# Altium footprint library SAMTEC THD.PcbLib: 161 footprints (part 12 of 12)
Each footprint in its own frame and in the unit in brackets; x right, y up, seen from the top. Pads: shape width x height; smd on the part's side, far side on the other; paste and mask are expansions set on the pad; w line width, h text height; cw(c..) or ccw(c..) is an arc to the next point about the centre after c.
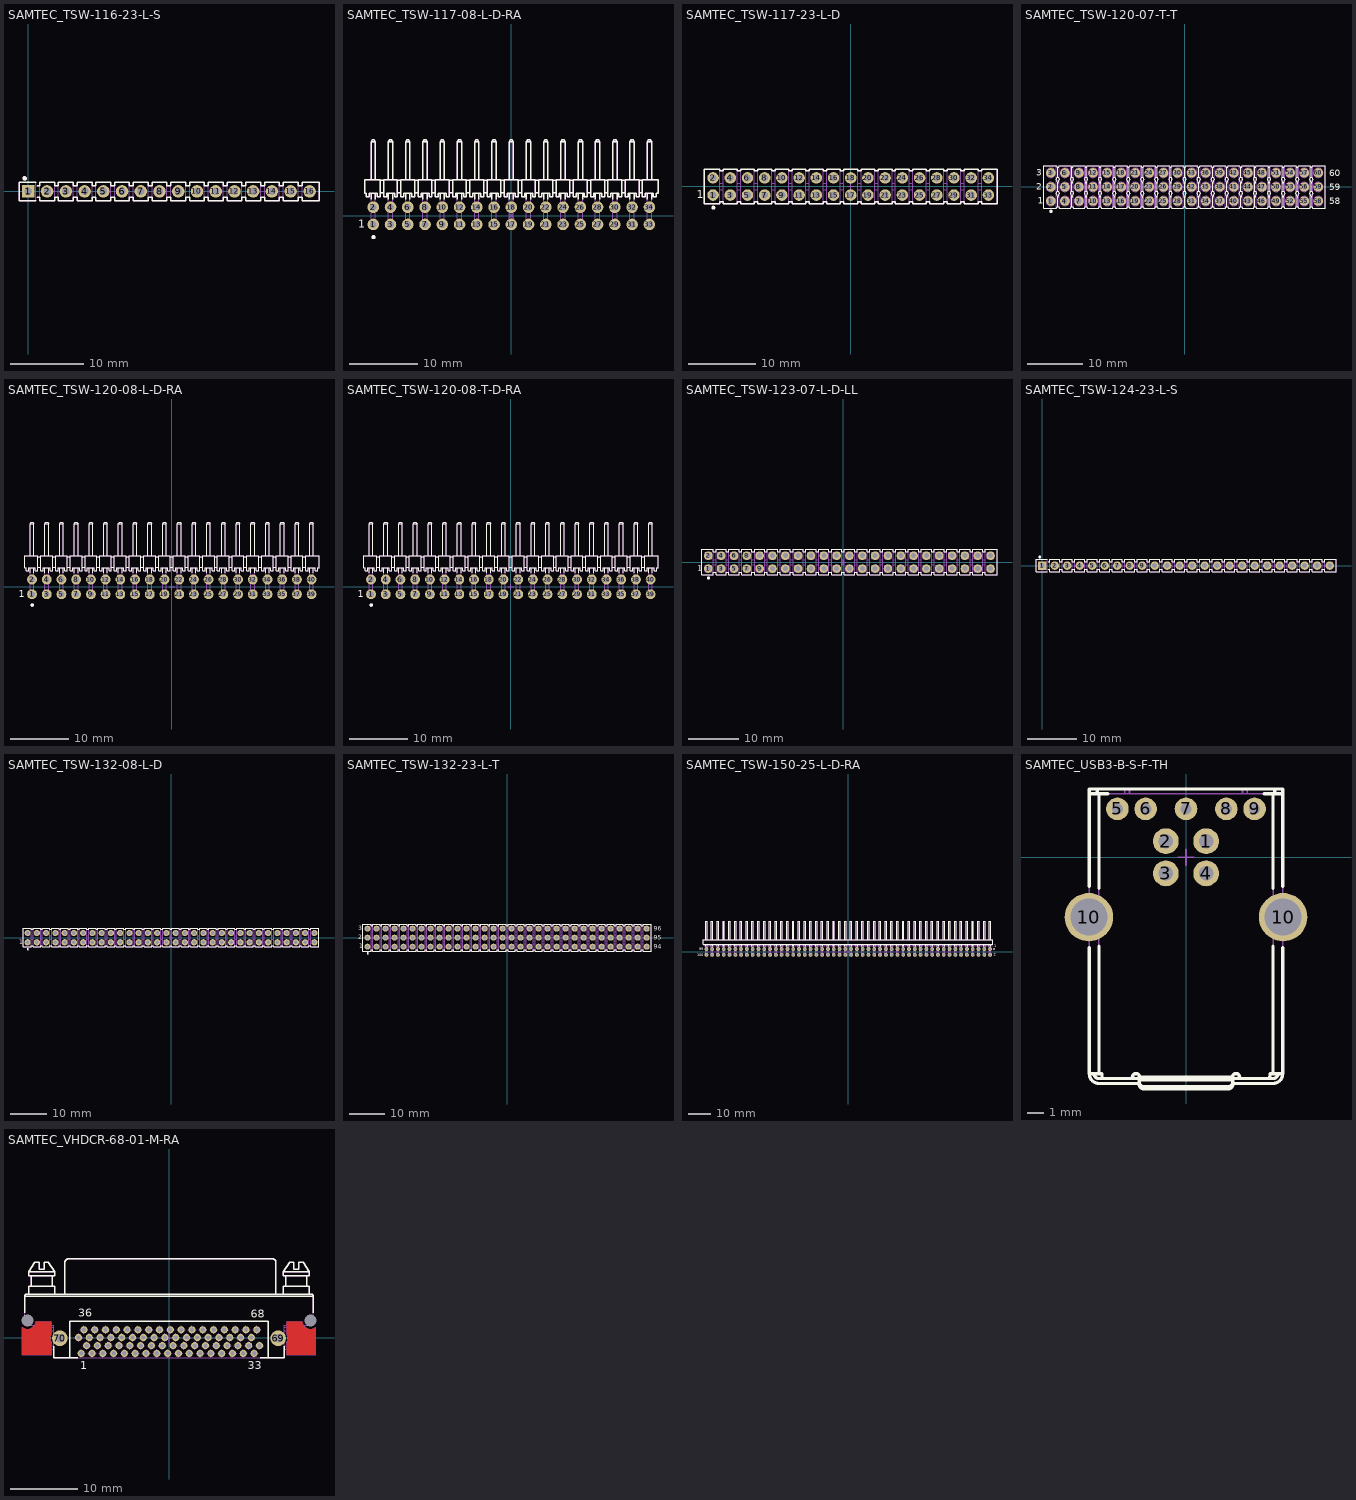
[diagram p11: the footprints below, top view; thin cyan lines are the x and y axes]

## SAMTEC_TSW-116-23-L-S [mm] "16 Contacts - Pitch 2.54mm - Single Row  Through Mount Straigh Header (Post Lead 5.84mm, Tail Lead 2.92mm, Insulator 2.54mm)"
height 8.38
pads (16):
  rect 1.7x1.7 hole 1: 1(0,0)
  round 1.7 hole 1: 2(2.54,0) 3(5.08,0) 4(7.62,0) 5(10.16,0) 6(12.7,0) 7(15.24,0) 8(17.78,0) 9(20.32,0) 10(22.86,0) 11(25.4,0) 12(27.94,0) 13(30.48,0) 14(33.02,0) 15(35.56,0) 16(38.13,0)
Top Overlay:
  drawing of 151 lines, arcs and shapes, not listed
Mechanical 8:
  lines w0.1: -0.5,0 0,0 ; 0,-0.5 0,0 ; 0,0.5 0,0 ; 0.5,0 0,0 ; 2.04,0 2.54,0 ; 2.54,-0.5 2.54,0 ; 2.54,0.5 2.54,0 ; 3.04,0 2.54,0 ; 4.58,0 5.08,0 ; 5.08,-0.5 5.08,0 ; 5.08,0.5 5.08,0 ; 5.58,0 5.08,0 ; 7.12,0 7.62,0 ; 7.62,-0.5 7.62,0 ; 7.62,0.5 7.62,0 ; 8.12,0 7.62,0 ; 9.66,0 10.16,0 ; 10.16,-0.5 10.16,0 ; 10.16,0.5 10.16,0 ; 10.66,0 10.16,0 ; 12.2,0 12.7,0 ; 12.7,-0.5 12.7,0 ; 12.7,0.5 12.7,0 ; 13.2,0 12.7,0 ; 14.74,0 15.24,0 ; 15.24,-0.5 15.24,0 ; 15.24,0.5 15.24,0 ; 15.74,0 15.24,0 ; 17.28,0 17.78,0 ; 17.78,-0.5 17.78,0 ; 17.78,0.5 17.78,0 ; 18.28,0 17.78,0 ; 19.82,0 20.32,0 ; 20.32,-0.5 20.32,0 ; 20.32,0.5 20.32,0 ; 20.82,0 20.32,0 ; 22.36,0 22.86,0 ; 22.86,-0.5 22.86,0 ; 22.86,0.5 22.86,0 ; 23.36,0 22.86,0 ; 24.9,0 25.4,0 ; 25.4,-0.5 25.4,0 ; 25.4,0.5 25.4,0 ; 25.9,0 25.4,0 ; 27.44,0 27.94,0 ; 27.94,-0.5 27.94,0 ; 27.94,0.5 27.94,0 ; 28.44,0 27.94,0 ; 29.98,0 30.48,0 ; 30.48,-0.5 30.48,0 ; 30.48,0.5 30.48,0 ; 30.98,0 30.48,0 ; 32.52,0 33.02,0 ; 33.02,-0.5 33.02,0 ; 33.02,0.5 33.02,0 ; 33.52,0 33.02,0 ; 35.06,0 35.56,0 ; 35.56,-0.5 35.56,0 ; 35.56,0.5 35.56,0 ; 36.06,0 35.56,0 ; 37.63,0 38.13,0 ; 38.13,-0.5 38.13,0 ; 38.13,0.5 38.13,0 ; 38.63,0 38.13,0
Mechanical 14:
  drawing of 185 lines, arcs and shapes, not listed
3D body "SAMTEC_TSW-116-23-L-S.stp": height 8.38, standoff -2.92, extent -1.27,-1.27 39.37,1.27

## SAMTEC_TSW-117-08-L-D-RA [mm] "34 Contacts - Pitch 2.54mm - Dual Row Through Mount  Right Angle Header (Post Lead 5.84mm, Tail Lead 5.08mm, Insulator 2.54mm)"
height 5.56
pads (34):
  round 1.7 hole 1: 1(-20.32,-1.27) 2(-20.32,1.27) 3(-17.78,-1.27) 4(-17.78,1.27) 5(-15.24,-1.27) 6(-15.24,1.27) 7(-12.7,-1.27) 8(-12.7,1.27) 9(-10.16,-1.27) 10(-10.16,1.27) 11(-7.62,-1.27) 12(-7.62,1.27) 13(-5.08,-1.27) 14(-5.08,1.27) 15(-2.54,-1.27) 16(-2.54,1.27) 17(0,-1.27) 18(0,1.27) 19(2.54,-1.27) 20(2.54,1.27) 21(5.08,-1.27) 22(5.08,1.27) 23(7.62,-1.27) 24(7.62,1.27) 25(10.16,-1.27) 26(10.16,1.27) 27(12.7,-1.27) 28(12.7,1.27) 29(15.24,-1.27) 30(15.24,1.27) 31(17.78,-1.27) 32(17.78,1.27) 33(20.32,-1.27) 34(20.32,1.27)
Top Overlay:
  drawing of 309 lines, arcs and shapes, not listed
  text "1" at -22.567,-1.768 h1.2
Mechanical 8:
  lines w0.1: -20.82,-1.27 -20.32,-1.27 ; -20.82,1.27 -20.32,1.27 ; -20.32,-1.77 -20.32,-1.27 ; -20.32,-0.77 -20.32,-1.27 ; -20.32,0.77 -20.32,1.27 ; -20.32,1.77 -20.32,1.27 ; -19.82,-1.27 -20.32,-1.27 ; -19.82,1.27 -20.32,1.27 ; -18.28,-1.27 -17.78,-1.27 ; -18.28,1.27 -17.78,1.27 ; -17.78,-1.77 -17.78,-1.27 ; -17.78,-0.77 -17.78,-1.27 ; -17.78,0.77 -17.78,1.27 ; -17.78,1.77 -17.78,1.27 ; -17.28,-1.27 -17.78,-1.27 ; -17.28,1.27 -17.78,1.27 ; -15.74,-1.27 -15.24,-1.27 ; -15.74,1.27 -15.24,1.27 ; -15.24,-1.77 -15.24,-1.27 ; -15.24,-0.77 -15.24,-1.27 ; -15.24,0.77 -15.24,1.27 ; -15.24,1.77 -15.24,1.27 ; -14.74,-1.27 -15.24,-1.27 ; -14.74,1.27 -15.24,1.27 ; -13.2,-1.27 -12.7,-1.27 ; -13.2,1.27 -12.7,1.27 ; -12.7,-1.77 -12.7,-1.27 ; -12.7,-0.77 -12.7,-1.27 ; -12.7,0.77 -12.7,1.27 ; -12.7,1.77 -12.7,1.27 ; -12.2,-1.27 -12.7,-1.27 ; -12.2,1.27 -12.7,1.27 ; -10.66,-1.27 -10.16,-1.27 ; -10.66,1.27 -10.16,1.27 ; -10.16,-1.77 -10.16,-1.27 ; -10.16,-0.77 -10.16,-1.27 ; -10.16,0.77 -10.16,1.27 ; -10.16,1.77 -10.16,1.27 ; -9.66,-1.27 -10.16,-1.27 ; -9.66,1.27 -10.16,1.27 ; -8.12,-1.27 -7.62,-1.27 ; -8.12,1.27 -7.62,1.27 ; -7.62,-1.77 -7.62,-1.27 ; -7.62,-0.77 -7.62,-1.27 ; -7.62,0.77 -7.62,1.27 ; -7.62,1.77 -7.62,1.27 ; -7.12,-1.27 -7.62,-1.27 ; -7.12,1.27 -7.62,1.27 ; -5.58,-1.27 -5.08,-1.27 ; -5.58,1.27 -5.08,1.27 ; -5.08,-1.77 -5.08,-1.27 ; -5.08,-0.77 -5.08,-1.27 ; -5.08,0.77 -5.08,1.27 ; -5.08,1.77 -5.08,1.27 ; -4.58,-1.27 -5.08,-1.27 ; -4.58,1.27 -5.08,1.27 ; -3.04,-1.27 -2.54,-1.27 ; -3.04,1.27 -2.54,1.27 ; -2.54,-1.77 -2.54,-1.27 ; -2.54,-0.77 -2.54,-1.27 ; -2.54,0.77 -2.54,1.27 ; -2.54,1.77 -2.54,1.27 ; -2.04,-1.27 -2.54,-1.27 ; -2.04,1.27 -2.54,1.27 ; -0.5,-1.27 0,-1.27 ; -0.5,1.27 0,1.27 ; -0.354,-0.354 0,0 ; -0.354,0.354 0,0 ; 0,-1.77 0,-1.27 ; 0,-0.77 0,-1.27 ; 0,0.77 0,1.27 ; 0,1.77 0,1.27 ; 0.354,-0.354 0,0 ; 0.354,0.354 0,0 ; 0.5,-1.27 0,-1.27 ; 0.5,1.27 0,1.27 ; 2.04,-1.27 2.54,-1.27 ; 2.04,1.27 2.54,1.27 ; 2.54,-1.77 2.54,-1.27 ; 2.54,-0.77 2.54,-1.27 ; 2.54,0.77 2.54,1.27 ; 2.54,1.77 2.54,1.27 ; 3.04,-1.27 2.54,-1.27 ; 3.04,1.27 2.54,1.27 ; 4.58,-1.27 5.08,-1.27 ; 4.58,1.27 5.08,1.27 ; 5.08,-1.77 5.08,-1.27 ; 5.08,-0.77 5.08,-1.27 ; 5.08,0.77 5.08,1.27 ; 5.08,1.77 5.08,1.27 ; 5.58,-1.27 5.08,-1.27 ; 5.58,1.27 5.08,1.27 ; 7.12,-1.27 7.62,-1.27 ; 7.12,1.27 7.62,1.27 ; 7.62,-1.77 7.62,-1.27 ; 7.62,-0.77 7.62,-1.27 ; 7.62,0.77 7.62,1.27 ; 7.62,1.77 7.62,1.27 ; 8.12,-1.27 7.62,-1.27 ; 8.12,1.27 7.62,1.27 ; 9.66,-1.27 10.16,-1.27 ; 9.66,1.27 10.16,1.27 ; 10.16,-1.77 10.16,-1.27 ; 10.16,-0.77 10.16,-1.27 ; 10.16,0.77 10.16,1.27 ; 10.16,1.77 10.16,1.27 ; 10.66,-1.27 10.16,-1.27 ; 10.66,1.27 10.16,1.27 ; 12.2,-1.27 12.7,-1.27 ; 12.2,1.27 12.7,1.27 ; 12.7,-1.77 12.7,-1.27 ; 12.7,-0.77 12.7,-1.27 ; 12.7,0.77 12.7,1.27 ; 12.7,1.77 12.7,1.27 ; 13.2,-1.27 12.7,-1.27 ; 13.2,1.27 12.7,1.27 ; 14.74,-1.27 15.24,-1.27 ; 14.74,1.27 15.24,1.27 ; 15.24,-1.77 15.24,-1.27 ; 15.24,-0.77 15.24,-1.27 ; 15.24,0.77 15.24,1.27 ; 15.24,1.77 15.24,1.27 ; 15.74,-1.27 15.24,-1.27 ; 15.74,1.27 15.24,1.27 ; 17.28,-1.27 17.78,-1.27 ; 17.28,1.27 17.78,1.27 ; 17.78,-1.77 17.78,-1.27 ; 17.78,-0.77 17.78,-1.27 ; 17.78,0.77 17.78,1.27 ; 17.78,1.77 17.78,1.27 ; 18.28,-1.27 17.78,-1.27 ; 18.28,1.27 17.78,1.27 ; 19.82,-1.27 20.32,-1.27 ; 19.82,1.27 20.32,1.27 ; 20.32,-1.77 20.32,-1.27 ; 20.32,-0.77 20.32,-1.27 ; 20.32,0.77 20.32,1.27 ; 20.32,1.77 20.32,1.27 ; 20.82,-1.27 20.32,-1.27 ; 20.82,1.27 20.32,1.27
Mechanical 14:
  drawing of 326 lines, arcs and shapes, not listed
  text "1" at -22.567,-1.768 h1.2
3D body "SAMTEC_TSW-117-08-L-D-RA.stp": height 5.56, standoff -2.29, extent -21.59,-1.587 21.59,11.176

## SAMTEC_TSW-117-23-L-D [mm] "34 Contacts - Pitch 2.54mm - Dual Row  Through Mount Straigh Header (Post Lead 5.84mm, Tail Lead 2.92mm, Insulator 2.54mm)"
height 8.38
pads (34):
  round 1.7 hole 1: 1(-20.32,-1.27) 2(-20.32,1.27) 3(-17.78,-1.27) 4(-17.78,1.27) 5(-15.24,-1.27) 6(-15.24,1.27) 7(-12.7,-1.27) 8(-12.7,1.27) 9(-10.16,-1.27) 10(-10.16,1.27) 11(-7.62,-1.27) 12(-7.62,1.27) 13(-5.08,-1.27) 14(-5.08,1.27) 15(-2.54,-1.27) 16(-2.54,1.27) 17(0,-1.27) 18(0,1.27) 19(2.54,-1.27) 20(2.54,1.27) 21(5.08,-1.27) 22(5.08,1.27) 23(7.62,-1.27) 24(7.62,1.27) 25(10.16,-1.27) 26(10.16,1.27) 27(12.7,-1.27) 28(12.7,1.27) 29(15.24,-1.27) 30(15.24,1.27) 31(17.78,-1.27) 32(17.78,1.27) 33(20.32,-1.27) 34(20.32,1.27)
Top Overlay:
  circle w0.3: c-20.285,-3.135 r0.15
  lines w0.2: -21.59,-2.54 -21.59,2.54 -19.304,2.54 -19.304,2.286 -18.796,2.286 -18.796,2.54 -16.764,2.54 -16.764,2.286 -16.256,2.286 -16.256,2.54 -14.224,2.54 -14.224,2.286 -13.716,2.286 -13.716,2.54 -11.684,2.54 -11.684,2.286 -11.176,2.286 -11.176,2.54 -9.144,2.54 -9.144,2.286 -8.636,2.286 -8.636,2.54 -6.604,2.54 -6.604,2.286 -6.096,2.286 -6.096,2.54 -4.064,2.54 -4.064,2.286 -3.556,2.286 -3.556,2.54 -1.524,2.54 -1.524,2.286 -1.016,2.286 -1.016,2.54 1.016,2.54 1.016,2.286 1.524,2.286 1.524,2.54 3.556,2.54 3.556,2.286 4.064,2.286 4.064,2.54 6.096,2.54 6.096,2.286 6.604,2.286 6.604,2.54 8.636,2.54 8.636,2.286 9.144,2.286 9.144,2.54 11.176,2.54 11.176,2.286 11.684,2.286 11.684,2.54 13.716,2.54 13.716,2.286 14.224,2.286 14.224,2.54 16.256,2.54 16.256,2.286 16.764,2.286 16.764,2.54 18.796,2.54 18.796,2.286 19.304,2.286 19.304,2.54 21.59,2.54 21.59,-2.54 19.304,-2.54 19.304,-2.286 18.796,-2.286 18.796,-2.54 16.764,-2.54 16.764,-2.286 16.256,-2.286 16.256,-2.54 14.224,-2.54 14.224,-2.286 13.716,-2.286 13.716,-2.54 11.684,-2.54 11.684,-2.286 11.176,-2.286 11.176,-2.54 9.144,-2.54 9.144,-2.286 8.636,-2.286 8.636,-2.54 6.604,-2.54 6.604,-2.286 6.096,-2.286 6.096,-2.54 4.064,-2.54 4.064,-2.286 3.556,-2.286 3.556,-2.54 1.524,-2.54 1.524,-2.286 1.016,-2.286 1.016,-2.54 -1.016,-2.54 -1.016,-2.286 -1.524,-2.286 -1.524,-2.54 -3.556,-2.54 -3.556,-2.286 -4.064,-2.286 -4.064,-2.54 -6.096,-2.54 -6.096,-2.286 -6.604,-2.286 -6.604,-2.54 -8.636,-2.54 -8.636,-2.286 -9.144,-2.286 -9.144,-2.54 -11.176,-2.54 -11.176,-2.286 -11.684,-2.286 -11.684,-2.54 -13.716,-2.54 -13.716,-2.286 -14.224,-2.286 -14.224,-2.54 -16.256,-2.54 -16.256,-2.286 -16.764,-2.286 -16.764,-2.54 -18.796,-2.54 -18.796,-2.286 -19.304,-2.286 -19.304,-2.54 -21.59,-2.54
  text "1" at -22.692,-1.768 h1.2
Mechanical 8:
  lines w0.05: -20.82,-1.27 -20.32,-1.27 ; -20.82,1.27 -20.32,1.27 ; -20.32,-1.77 -20.32,-1.27 ; -20.32,-0.77 -20.32,-1.27 ; -20.32,0.77 -20.32,1.27 ; -20.32,1.77 -20.32,1.27 ; -19.82,-1.27 -20.32,-1.27 ; -19.82,1.27 -20.32,1.27 ; -18.28,-1.27 -17.78,-1.27 ; -18.28,1.27 -17.78,1.27 ; -17.78,-1.77 -17.78,-1.27 ; -17.78,-0.77 -17.78,-1.27 ; -17.78,0.77 -17.78,1.27 ; -17.78,1.77 -17.78,1.27 ; -17.28,-1.27 -17.78,-1.27 ; -17.28,1.27 -17.78,1.27 ; -15.74,-1.27 -15.24,-1.27 ; -15.74,1.27 -15.24,1.27 ; -15.24,-1.77 -15.24,-1.27 ; -15.24,-0.77 -15.24,-1.27 ; -15.24,0.77 -15.24,1.27 ; -15.24,1.77 -15.24,1.27 ; -14.74,-1.27 -15.24,-1.27 ; -14.74,1.27 -15.24,1.27 ; -13.2,-1.27 -12.7,-1.27 ; -13.2,1.27 -12.7,1.27 ; -12.7,-1.77 -12.7,-1.27 ; -12.7,-0.77 -12.7,-1.27 ; -12.7,0.77 -12.7,1.27 ; -12.7,1.77 -12.7,1.27 ; -12.2,-1.27 -12.7,-1.27 ; -12.2,1.27 -12.7,1.27 ; -10.66,-1.27 -10.16,-1.27 ; -10.66,1.27 -10.16,1.27 ; -10.16,-1.77 -10.16,-1.27 ; -10.16,-0.77 -10.16,-1.27 ; -10.16,0.77 -10.16,1.27 ; -10.16,1.77 -10.16,1.27 ; -9.66,-1.27 -10.16,-1.27 ; -9.66,1.27 -10.16,1.27 ; -8.12,-1.27 -7.62,-1.27 ; -8.12,1.27 -7.62,1.27 ; -7.62,-1.77 -7.62,-1.27 ; -7.62,-0.77 -7.62,-1.27 ; -7.62,0.77 -7.62,1.27 ; -7.62,1.77 -7.62,1.27 ; -7.12,-1.27 -7.62,-1.27 ; -7.12,1.27 -7.62,1.27 ; -5.58,-1.27 -5.08,-1.27 ; -5.58,1.27 -5.08,1.27 ; -5.08,-1.77 -5.08,-1.27 ; -5.08,-0.77 -5.08,-1.27 ; -5.08,0.77 -5.08,1.27 ; -5.08,1.77 -5.08,1.27 ; -4.58,-1.27 -5.08,-1.27 ; -4.58,1.27 -5.08,1.27 ; -3.04,-1.27 -2.54,-1.27 ; -3.04,1.27 -2.54,1.27 ; -2.54,-1.77 -2.54,-1.27 ; -2.54,-0.77 -2.54,-1.27 ; -2.54,0.77 -2.54,1.27 ; -2.54,1.77 -2.54,1.27 ; -2.04,-1.27 -2.54,-1.27 ; -2.04,1.27 -2.54,1.27 ; -0.5,-1.27 0,-1.27 ; -0.5,0 0,0 ; -0.5,1.27 0,1.27 ; 0,-1.77 0,-1.27 ; 0,-0.77 0,-1.27 ; 0,-0.5 0,0 ; 0,0.5 0,0 ; 0,0.77 0,1.27 ; 0,1.77 0,1.27 ; 0.5,-1.27 0,-1.27 ; 0.5,0 0,0 ; 0.5,1.27 0,1.27 ; 2.04,-1.27 2.54,-1.27 ; 2.04,1.27 2.54,1.27 ; 2.54,-1.77 2.54,-1.27 ; 2.54,-0.77 2.54,-1.27 ; 2.54,0.77 2.54,1.27 ; 2.54,1.77 2.54,1.27 ; 3.04,-1.27 2.54,-1.27 ; 3.04,1.27 2.54,1.27 ; 4.58,-1.27 5.08,-1.27 ; 4.58,1.27 5.08,1.27 ; 5.08,-1.77 5.08,-1.27 ; 5.08,-0.77 5.08,-1.27 ; 5.08,0.77 5.08,1.27 ; 5.08,1.77 5.08,1.27 ; 5.58,-1.27 5.08,-1.27 ; 5.58,1.27 5.08,1.27 ; 7.12,-1.27 7.62,-1.27 ; 7.12,1.27 7.62,1.27 ; 7.62,-1.77 7.62,-1.27 ; 7.62,-0.77 7.62,-1.27 ; 7.62,0.77 7.62,1.27 ; 7.62,1.77 7.62,1.27 ; 8.12,-1.27 7.62,-1.27 ; 8.12,1.27 7.62,1.27 ; 9.66,-1.27 10.16,-1.27 ; 9.66,1.27 10.16,1.27 ; 10.16,-1.77 10.16,-1.27 ; 10.16,-0.77 10.16,-1.27 ; 10.16,0.77 10.16,1.27 ; 10.16,1.77 10.16,1.27 ; 10.66,-1.27 10.16,-1.27 ; 10.66,1.27 10.16,1.27 ; 12.2,-1.27 12.7,-1.27 ; 12.2,1.27 12.7,1.27 ; 12.7,-1.77 12.7,-1.27 ; 12.7,-0.77 12.7,-1.27 ; 12.7,0.77 12.7,1.27 ; 12.7,1.77 12.7,1.27 ; 13.2,-1.27 12.7,-1.27 ; 13.2,1.27 12.7,1.27 ; 14.74,-1.27 15.24,-1.27 ; 14.74,1.27 15.24,1.27 ; 15.24,-1.77 15.24,-1.27 ; 15.24,-0.77 15.24,-1.27 ; 15.24,0.77 15.24,1.27 ; 15.24,1.77 15.24,1.27 ; 15.74,-1.27 15.24,-1.27 ; 15.74,1.27 15.24,1.27 ; 17.28,-1.27 17.78,-1.27 ; 17.28,1.27 17.78,1.27 ; 17.78,-1.77 17.78,-1.27 ; 17.78,-0.77 17.78,-1.27 ; 17.78,0.77 17.78,1.27 ; 17.78,1.77 17.78,1.27 ; 18.28,-1.27 17.78,-1.27 ; 18.28,1.27 17.78,1.27 ; 19.82,-1.27 20.32,-1.27 ; 19.82,1.27 20.32,1.27 ; 20.32,-1.77 20.32,-1.27 ; 20.32,-0.77 20.32,-1.27 ; 20.32,0.77 20.32,1.27 ; 20.32,1.77 20.32,1.27 ; 20.82,-1.27 20.32,-1.27 ; 20.82,1.27 20.32,1.27
Mechanical 14:
  lines w0.1: -19.304,-2.286 -18.796,-2.286 ; -19.304,-0.508 -18.796,-0.508 ; -19.304,0.508 -18.796,0.508 ; -19.304,2.286 -18.796,2.286 ; -16.764,-2.286 -16.256,-2.286 ; -16.764,-0.508 -16.256,-0.508 ; -16.764,0.508 -16.256,0.508 ; -16.764,2.286 -16.256,2.286 ; -14.224,-2.286 -13.716,-2.286 ; -14.224,-0.508 -13.716,-0.508 ; -14.224,0.508 -13.716,0.508 ; -14.224,2.286 -13.716,2.286 ; -11.684,-2.286 -11.176,-2.286 ; -11.684,-0.508 -11.176,-0.508 ; -11.684,0.508 -11.176,0.508 ; -11.684,2.286 -11.176,2.286 ; -9.144,-2.286 -8.636,-2.286 ; -9.144,-0.508 -8.636,-0.508 ; -9.144,0.508 -8.636,0.508 ; -9.144,2.286 -8.636,2.286 ; -6.604,-2.286 -6.096,-2.286 ; -6.604,-0.508 -6.096,-0.508 ; -6.604,0.508 -6.096,0.508 ; -6.604,2.286 -6.096,2.286 ; -4.064,-2.286 -3.556,-2.286 ; -4.064,-0.508 -3.556,-0.508 ; -4.064,0.508 -3.556,0.508 ; -4.064,2.286 -3.556,2.286 ; -1.524,-2.286 -1.016,-2.286 ; -1.524,-0.508 -1.016,-0.508 ; -1.524,0.508 -1.016,0.508 ; -1.524,2.286 -1.016,2.286 ; 1.016,-2.286 1.524,-2.286 ; 1.016,-0.508 1.524,-0.508 ; 1.016,0.508 1.524,0.508 ; 1.016,2.286 1.524,2.286 ; 3.556,-2.286 4.064,-2.286 ; 3.556,-0.508 4.064,-0.508 ; 3.556,0.508 4.064,0.508 ; 3.556,2.286 4.064,2.286 ; 6.096,-2.286 6.604,-2.286 ; 6.096,-0.508 6.604,-0.508 ; 6.096,0.508 6.604,0.508 ; 6.096,2.286 6.604,2.286 ; 8.636,-2.286 9.144,-2.286 ; 8.636,-0.508 9.144,-0.508 ; 8.636,0.508 9.144,0.508 ; 8.636,2.286 9.144,2.286 ; 11.176,-2.286 11.684,-2.286 ; 11.176,-0.508 11.684,-0.508 ; 11.176,0.508 11.684,0.508 ; 11.176,2.286 11.684,2.286 ; 13.716,-2.286 14.224,-2.286 ; 13.716,-0.508 14.224,-0.508 ; 13.716,0.508 14.224,0.508 ; 13.716,2.286 14.224,2.286 ; 16.256,-2.286 16.764,-2.286 ; 16.256,-0.508 16.764,-0.508 ; 16.256,0.508 16.764,0.508 ; 16.256,2.286 16.764,2.286 ; 18.796,-2.286 19.304,-2.286 ; 18.796,-0.508 19.304,-0.508 ; 18.796,0.508 19.304,0.508 ; 18.796,2.286 19.304,2.286 ; -21.59,-2.54 -19.304,-2.54 -19.304,2.54 -21.59,2.54 -21.59,-2.54 ; -18.796,-2.54 -16.764,-2.54 -16.764,2.54 -18.796,2.54 -18.796,-2.54 ; -16.256,-2.54 -16.256,2.54 -14.224,2.54 -14.224,-2.54 -16.256,-2.54 ; -13.716,-2.54 -11.684,-2.54 -11.684,2.54 -13.716,2.54 -13.716,-2.54 ; -11.176,-2.54 -9.144,-2.54 -9.144,2.54 -11.176,2.54 -11.176,-2.54 ; -8.636,-2.54 -6.604,-2.54 -6.604,2.54 -8.636,2.54 -8.636,-2.54 ; -6.096,-2.54 -4.064,-2.54 -4.064,2.54 -6.096,2.54 -6.096,-2.54 ; -3.556,-2.54 -1.524,-2.54 -1.524,2.54 -3.556,2.54 -3.556,-2.54 ; -1.016,-2.54 1.016,-2.54 1.016,2.54 -1.016,2.54 -1.016,-2.54 ; 1.524,-2.54 3.556,-2.54 3.556,2.54 1.524,2.54 1.524,-2.54 ; 4.064,-2.54 6.096,-2.54 6.096,2.54 4.064,2.54 4.064,-2.54 ; 6.604,-2.54 8.636,-2.54 8.636,2.54 6.604,2.54 6.604,-2.54 ; 9.144,-2.54 11.176,-2.54 11.176,2.54 9.144,2.54 9.144,-2.54 ; 11.684,-2.54 13.716,-2.54 13.716,2.54 11.684,2.54 11.684,-2.54 ; 14.224,-2.54 16.256,-2.54 16.256,2.54 14.224,2.54 14.224,-2.54 ; 16.764,-2.54 18.796,-2.54 18.796,2.54 16.764,2.54 16.764,-2.54 ; 19.304,-2.54 21.59,-2.54 21.59,2.54 19.304,2.54 19.304,-2.54
3D body "SAMTEC_TSW-117-23-L-D.stp": height 8.38, standoff -2.92, extent -21.59,-2.54 21.59,2.54

## SAMTEC_TSW-120-07-T-T [mm] "60 Contacts - Pitch 2.54mm - Triple Row Through Mount Straigh Header (Post Lead 5.84mm, Tail Lead 2.54mm, Insulator 2.54mm)"
height 8.38
pads (60):
  round 1.7 hole 1: 1(-24.13,-2.54) 2(-24.13,0) 3(-24.13,2.54) 4(-21.59,-2.54) 5(-21.59,0) 6(-21.59,2.54) 7(-19.05,-2.54) 8(-19.05,0) 9(-19.05,2.54) 10(-16.51,-2.54) 11(-16.51,0) 12(-16.51,2.54) 13(-13.97,-2.54) 14(-13.97,0) 15(-13.97,2.54) 16(-11.43,-2.54) 17(-11.43,0) 18(-11.43,2.54) 19(-8.89,-2.54) 20(-8.89,0) 21(-8.89,2.54) 22(-6.35,-2.54) 23(-6.35,0) 24(-6.35,2.54) 25(-3.81,-2.54) 26(-3.81,0) 27(-3.81,2.54) 28(-1.27,-2.54) 29(-1.27,0) 30(-1.27,2.54) 31(1.27,-2.54) 32(1.27,0) 33(1.27,2.54) 34(3.81,-2.54) 35(3.81,0) 36(3.81,2.54) 37(6.35,-2.54) 38(6.35,0) 39(6.35,2.54) 40(8.89,-2.54) 41(8.89,0) 42(8.89,2.54) 43(11.43,-2.54) 44(11.43,0) 45(11.43,2.54) 46(13.97,-2.54) 47(13.97,0) 48(13.97,2.54) 49(16.51,-2.54) 50(16.51,0) 51(16.51,2.54) 52(19.05,-2.54) 53(19.05,0) 54(19.05,2.54) 55(21.59,-2.54) 56(21.59,0) 57(21.59,2.54) 58(24.13,-2.54) 59(24.13,0) 60(24.13,2.54)
Top Overlay:
  drawing of 442 lines, arcs and shapes, not listed
  text "60" at 26.125,1.96 h1.2
  text "59" at 26.125,-0.58 h1.2
  text "1" at -26.502,-3.038 h1.2
  text "2" at -26.802,-0.498 h1.2
  text "58" at 26.125,-3.12 h1.2
  text "3" at -26.802,2.042 h1.2
Mechanical 8:
  drawing of 182 lines, arcs and shapes, not listed
Mechanical 14:
  drawing of 1200 lines, arcs and shapes, not listed
  text "60" at 26.125,1.96 h1.2
  text "59" at 26.125,-0.58 h1.2
  text "1" at -26.502,-3.038 h1.2
  text "2" at -26.802,-0.498 h1.2
  text "58" at 26.125,-3.12 h1.2
  text "3" at -26.802,2.042 h1.2
3D body "SAMTEC_TSW-120-07-T-T.stp": height 8.38, standoff -2.54, extent -25.4,-3.81 25.4,3.81
